# Altium footprint library SMT IC footprints.PcbLib: 363 footprints (part 1 of 23)
Each footprint in its own frame and in the unit in brackets; x right, y up, seen from the top. Pads: shape width x height; smd on the part's side, far side on the other; paste and mask are expansions set on the pad; w line width, h text height; cw(c..) or ccw(c..) is an arc to the next point about the centre after c.
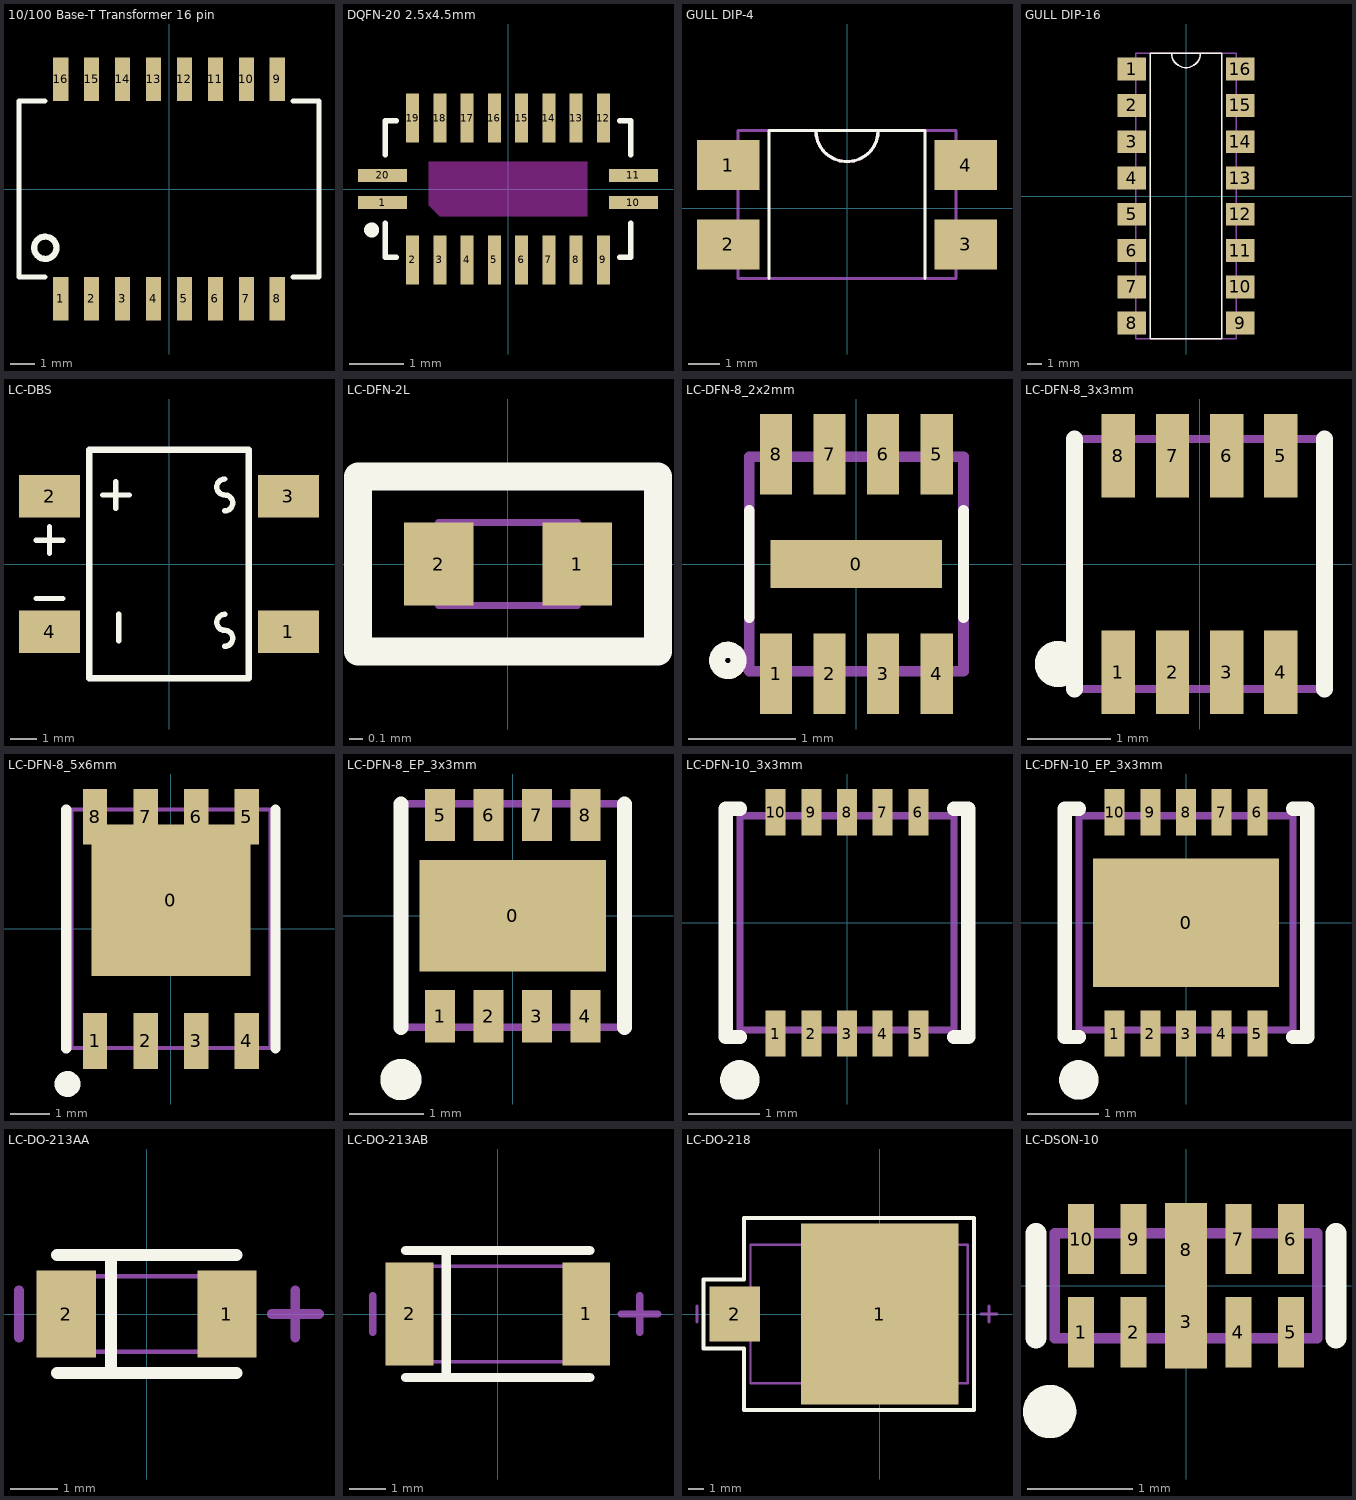
[diagram p0: the footprints below, top view; thin cyan lines are the x and y axes]

## 10/100 Base-T Transformer 16 pin [mm] "10/100 Base-T Transformer 16 pin"
height 6
pads (16):
  rect 0.62x1.78 smd: 1(-4.445,-4.511) 2(-3.175,-4.511) 3(-1.905,-4.511) 4(-0.635,-4.511) 5(0.635,-4.511) 6(1.905,-4.511) 7(3.175,-4.511) 8(4.445,-4.511) 9(4.445,4.511) 10(3.175,4.511) 11(1.905,4.511) 12(0.635,4.511) 13(-0.635,4.511) 14(-1.905,4.511) 15(-3.175,4.511) 16(-4.445,4.511)
Top Overlay:
  circle w0.254: c-5.08,-2.413 r0.458
  lines w0.2: -5.08,-3.619 -6.159,-3.619 -6.159,3.619 -5.08,3.619 ; 5.08,-3.619 6.159,-3.619 6.159,3.619 5.08,3.619
3D body "b78476a8247a003.STEP": height 5.6, standoff 0, extent -6.35,-4.701 6.35,4.699

## DQFN-20 2.5x4.5mm [mm] "DQFN-20 2.5x4.5mm"
height 0.8
pads (20):
  rect 0.9x0.24 smd mask+0.05: 1(-2.3,-0.25) 10(2.3,-0.25) 11(2.3,0.25) 20(-2.3,0.25)
  rect 0.24x0.9 smd mask+0.05: 2(-1.75,-1.3) 3(-1.25,-1.3) 4(-0.75,-1.3) 5(-0.25,-1.3) 6(0.25,-1.3) 7(0.75,-1.3) 8(1.25,-1.3) 9(1.75,-1.3) 12(1.75,1.3) 13(1.25,1.3) 14(0.75,1.3) 15(0.25,1.3) 16(-0.25,1.3) 17(-0.75,1.3) 18(-1.25,1.3) 19(-1.75,1.3)
Top Layer keep-out:
  region: -1.45,0.5 -1.45,-0.3 -1.25,-0.5 1.45,-0.5 1.45,0.5
Top Overlay:
  circle w0.254: c-2.5,-0.75 r0.01
  lines w0.1: -2.25,-0.625 -2.25,-1.25 -2.05,-1.25 ; -2.25,0.625 -2.25,1.25 -2.05,1.25 ; 2.05,-1.25 2.25,-1.25 2.25,-0.625 ; 2.05,1.25 2.25,1.25 2.25,0.625
3D body: height 0.8, standoff 0.1, extent -2.25,-1.25 2.25,1.25

## GULL DIP-4 [mm] "Dual inline package 4 lead 2.54mm SMT"
height 4
pads (4):
  rect 2x1.6 smd: 1(-3.81,1.39) 2(-3.81,-1.15) 3(3.81,-1.15) 4(3.81,1.39)
Top Overlay:
  lines w0.1: -2.5,-2.25 -2.5,2.5 2.5,2.5 2.5,-2.25 ; -1,2.5 ccw(c0,2.5) 1,2.5
Mechanical 1:
  lines w0.1: -1,2.5 ccw(c0,2.5) 1,2.5 ; -3.5,-2.25 -3.5,2.5 0,2.5 3.5,2.5 3.5,-2.25 -3.5,-2.25

## GULL DIP-16 [mm] "SMT DIP 16 package"
height 5
pads (16):
  rect 2x1.6 smd: 1(-3.81,8.89) 2(-3.81,6.35) 3(-3.81,3.81) 4(-3.81,1.27) 5(-3.81,-1.27) 6(-3.81,-3.81) 7(-3.81,-6.35) 8(-3.81,-8.89) 9(3.81,-8.89) 10(3.81,-6.35) 11(3.81,-3.81) 12(3.81,-1.27) 13(3.81,1.27) 14(3.81,3.81) 15(3.81,6.35) 16(3.81,8.89)
Top Overlay:
  lines w0.1: -1,10 ccw(c0,10) 1,10 ; -2.5,-10 -2.5,10 2.5,10 2.5,-10 -2.5,-10
Mechanical 1:
  lines w0.1: -1,10 ccw(c0,10) 1,10 ; -3.5,-10 -3.5,10 0,10 3.5,10 3.5,-10 -3.5,-10

## LC-DBS [mm]
pads (4):
  rect 2.3x1.6 smd: 1(4.5,-2.55) 2(-4.5,2.55) 3(4.5,2.55) 4(-4.5,-2.55)
Top Overlay:
  lines w0.203: -5,-1.3 -4,-1.3 ; -5,0.9 -4,0.9 ; -4.5,0.4 -4.5,1.4 ; -2.5,2.6 -1.5,2.6 ; -2,2.1 -2,3.1 ; -1.9,-2.9 -1.9,-1.9 ; 2.1,-3.1 ccw(c2.1,-2.8) 2.1,-2.5 cw(c2.1,-2.2) 2.1,-1.9 ; 2.1,2 ccw(c2.1,2.3) 2.1,2.6 cw(c2.1,2.9) 2.1,3.2
  lines w0.254: -3,-4.3 3,-4.3 3,4.3 -3,4.3 -3,-4.3

## LC-DFN-2L [mm]
pads (2):
  rect 0.5x0.6 smd: 1(0.5,0) 2(-0.5,0)
Top Overlay:
  lines w0.203: -1.08,-0.63 -1.08,0.63 1.08,0.63 1.08,-0.63 -1.08,-0.63
Mechanical 13:
  lines w0.051: -0.5,-0.3 0.5,-0.3 0.5,0.3 -0.5,0.3 -0.5,-0.3

## LC-DFN-8_2x2mm [mm]
height 0.6
pads (9):
  rect 1.6x0.45 smd: 0(0,0)
  rect 0.3x0.75 smd mask+0.051: 1(-0.75,-1.025) 2(-0.25,-1.025) 3(0.25,-1.025) 4(0.75,-1.025) 5(0.75,1.025) 6(0.25,1.025) 7(-0.25,1.025) 8(-0.75,1.025)
Top Overlay:
  circle w0.15: c-1.2,-0.9 r0.1
  lines w0.1: -1,-0.5 -1,0.5 ; 1,-0.5 1,0.5
Mechanical 13:
  lines w0.1: -1,-1 -1,1 1,1 1,-1 -1,-1

## LC-DFN-8_3x3mm [mm]
pads (8):
  rect 0.4x1 smd mask+0.051: 1(-0.975,-1.3) 2(-0.325,-1.3) 3(0.325,-1.3) 4(0.975,-1.3) 5(0.975,1.3) 6(0.325,1.3) 7(-0.325,1.3) 8(-0.975,1.3)
Top Overlay:
  circle w0.3: c-1.7,-1.2 r0.127
  lines w0.203: -1.5,-1.5 -1.5,1.5 ; 1.5,-1.5 1.5,1.5
Mechanical 13:
  lines w0.1: -1.5,-1.5 -1.5,1.5 1.5,1.5 1.5,-1.5 -1.5,-1.5

## LC-DFN-8_5x6mm [mm]
pads (9):
  rect 4x3.81 smd: 0(0,0.716)
  rect 0.61x1.4 smd: 1(-1.905,-2.816) 2(-0.635,-2.816) 3(0.635,-2.816) 4(1.905,-2.816) 5(1.905,2.816) 6(0.635,2.816) 7(-0.635,2.816) 8(-1.905,2.816)
Top Overlay:
  circle w0.4: c-2.6,-3.9 r0.125
  lines w0.254: -2.63,-3 -2.63,3 ; 2.63,-3 2.63,3
Mechanical 13:
  lines w0.1: -2.5,-3 2.5,-3 2.5,3 -2.5,3 -2.5,-3

## LC-DFN-8_EP_3x3mm [mm]
pads (9):
  rect 2.5x1.5 smd mask+0.051: 0(0,0)
  rect 0.4x0.7 smd mask+0.051: 1(-0.975,-1.35) 2(-0.325,-1.35) 3(0.325,-1.35) 4(0.975,-1.35) 5(-0.975,1.35) 6(-0.325,1.35) 7(0.325,1.35) 8(0.975,1.35)
Top Overlay:
  circle w0.3: c-1.5,-2.2 r0.127
  lines w0.203: -1.5,-1.5 -1.5,1.5 ; 1.5,-1.5 1.5,1.5
Mechanical 13:
  lines w0.1: -1.5,-1.5 1.5,-1.5 1.5,1.5 -1.5,1.5 -1.5,-1.5

## LC-DFN-10_3x3mm [mm]
pads (10):
  rect 0.28x0.65 smd mask+0.051: 1(-1,-1.55) 2(-0.5,-1.55) 3(0,-1.55) 4(0.5,-1.55) 5(1,-1.55) 6(1,1.55) 7(0.5,1.55) 8(0,1.55) 9(-0.5,1.55) 10(-1,1.55)
Top Overlay:
  circle w0.3: c-1.5,-2.2 r0.127
  lines w0.2: -1.5,-1.6 -1.7,-1.6 -1.7,1.6 -1.5,1.6 ; 1.5,-1.6 1.7,-1.6 1.7,1.6 1.5,1.6
Mechanical 13:
  lines w0.1: -1.5,-1.5 -1.5,1.5 1.5,1.5 1.5,-1.5 -1.5,-1.5

## LC-DFN-10_EP_3x3mm [mm]
pads (11):
  rect 2.6x1.8 smd mask+0.051: 0(0,0)
  rect 0.28x0.65 smd mask+0.051: 1(-1,-1.55) 2(-0.5,-1.55) 3(0,-1.55) 4(0.5,-1.55) 5(1,-1.55) 6(1,1.55) 7(0.5,1.55) 8(0,1.55) 9(-0.5,1.55) 10(-1,1.55)
Top Overlay:
  circle w0.3: c-1.5,-2.2 r0.127
  lines w0.2: -1.5,-1.6 -1.7,-1.6 -1.7,1.6 -1.5,1.6 ; 1.5,-1.6 1.7,-1.6 1.7,1.6 1.5,1.6
Mechanical 13:
  lines w0.1: -1.5,-1.5 1.5,-1.5 1.5,1.5 -1.5,1.5 -1.5,-1.5

## LC-DO-213AA [mm]
pads (2):
  rect 1.25x1.85 smd: 1(1.7,0) 2(-1.7,0)
Top Overlay:
  lines w0.254: -1.9,-1.25 1.9,-1.25 ; -1.9,1.25 1.9,1.25 ; -0.75,-1.25 -0.75,1.25
Mechanical 13:
  lines w0.1: -1.8,-0.8 -1.8,0.8 1.8,0.8 1.8,-0.8 -1.8,-0.8
Mechanical 15:
  lines w0.203: -2.7,-0.5 -2.7,0.5 ; 2.65,0 3.65,0 ; 3.15,-0.5 3.15,0.5

## LC-DO-213AB [mm]
pads (2):
  rect 1.3x2.8 smd: 1(2.4,0) 2(-2.4,0)
Top Overlay:
  lines w0.254: -2.5,-1.725 2.5,-1.725 ; -2.5,1.725 2.5,1.725 ; -1.4,-1.725 -1.4,1.7
Mechanical 13:
  lines w0.1: -2.5,-1.3 2.5,-1.3 2.5,1.3 -2.5,1.3 -2.5,-1.3
Mechanical 15:
  lines w0.203: -3.4,-0.5 -3.4,0.5 ; 3.35,0 4.35,0 ; 3.85,-0.5 3.85,0.5

## LC-DO-218 [mm] "=DO-218AB"
pads (2):
  rect 10x11.5 smd: 1(0,0)
  rect 3.2x3.5 smd: 2(-9.2,0)
Top Overlay:
  lines w0.254: -11.2,-2.2 -11.2,2.2 -8.6,2.2 -8.6,6.1 6,6.1 6,-6.1 -8.6,-6.1 -8.6,-2.2 -11.2,-2.2
Mechanical 13:
  lines w0.152: -8.2,-4.4 -8.2,4.4 5.6,4.4 5.6,-4.4 -8.2,-4.4
Mechanical 15:
  lines w0.203: -11.6,-0.5 -11.6,0.5 ; 6.45,0 7.45,0 ; 6.95,-0.5 6.95,0.5
3D body "User Library-DO-218AB.STEP": height 5, standoff 0, extent -9.8,-5 5.629,5

## LC-DSON-10 [mm]
pads (10):
  rect 0.25x0.67 smd mask+0.051: 1(-1,-0.445) 2(-0.5,-0.445) 4(0.5,-0.445) 5(1,-0.445) 6(1,0.445) 7(0.5,0.445) 9(-0.5,0.445) 10(-1,0.445)
  rect 0.4x0.889 smd mask+0.051: 3(0,-0.343) 8(0,0.343)
Top Overlay:
  circle w0.254: c-1.3,-1.2 r0.127
  lines w0.2: -1.43,-0.5 -1.43,0.5 ; 1.43,-0.5 1.43,0.5
Mechanical 13:
  lines w0.1: -1.25,-0.5 1.25,-0.5 1.25,0.5 -1.25,0.5 -1.25,-0.5